# Altium footprint library goldpin_pcb.PcbLib: 235 footprints (part 10 of 15)
Each footprint in its own frame and in the unit in brackets; x right, y up, seen from the top. Pads: shape width x height; smd on the part's side, far side on the other; paste and mask are expansions set on the pad; w line width, h text height; cw(c..) or ccw(c..) is an arc to the next point about the centre after c.
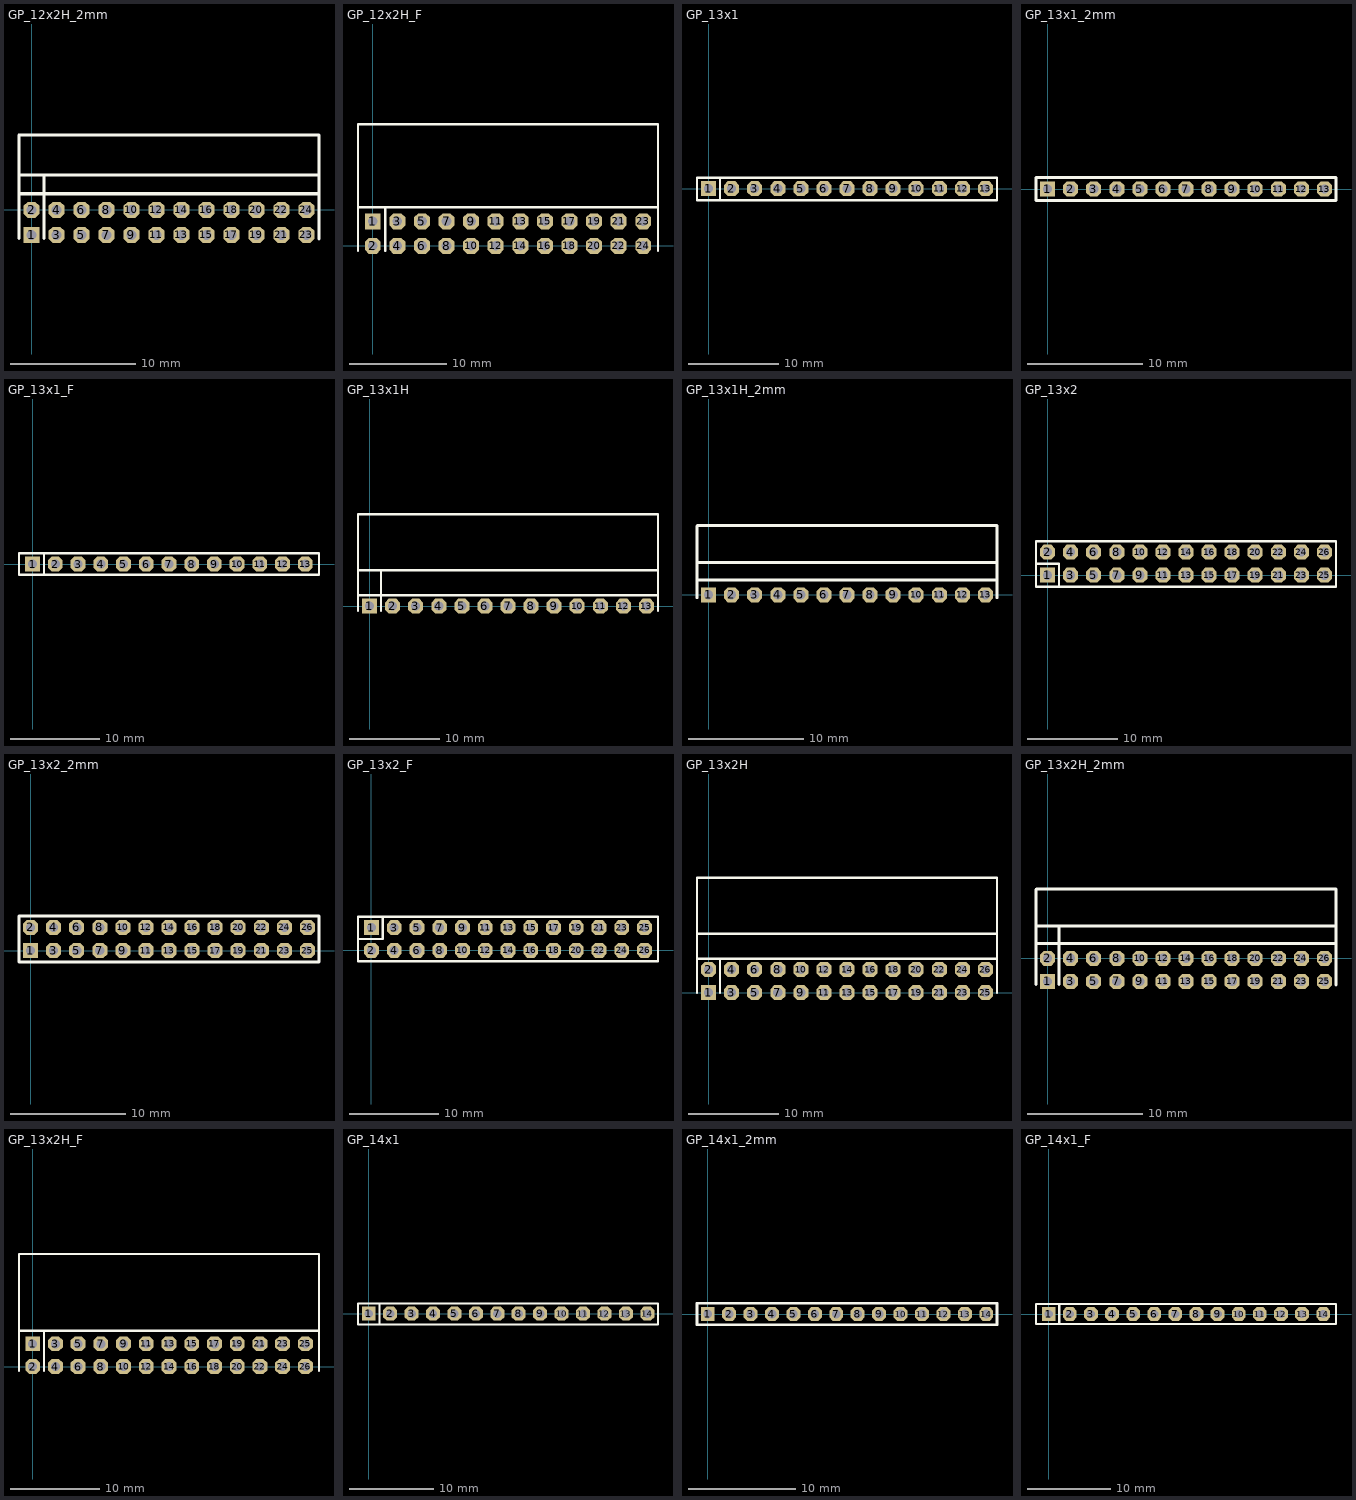
[diagram p9: the footprints below, top view; thin cyan lines are the x and y axes]

## GP_12x2H_2mm [mm]
height 4.45
pads (24):
  rect 1.3x1.3 hole 0.8: 1(0,-2)
  oct 1.3x1.3 hole 0.8: 2(0,0) 3(2,-2) 4(2,0) 5(4,-2) 6(4,0) 7(6,-2) 8(6,0) 9(8,-2) 10(8,0) 11(10,-2) 12(10,0) 13(12,-2) 14(12,0) 15(14,-2) 16(14,0) 17(16,-2) 18(16,0) 19(18,-2) 20(18,0) 21(20,-2) 22(20,0) 23(22,-2) 24(22,0)
Top Overlay:
  lines w0.254: -1,-2.275 -1,1.822 -1,5.973 ; -1,1.3 23,1.3 ; -1,2.8 23,2.8 ; 0.99,-2.275 0.99,2.775 ; 23,-2.3 23,6
  lines w0.256: -1,5.973 -0.973,6 23,6
3D body: height 3.97, standoff -3.02, extent -1.025,-2.261 22.975,5.961

## GP_12x2H_F [mil]
pads (24):
  rect 65x65 hole 39.37: 1(0,100)
  oct 65x65 hole 39.37: 2(0,0) 3(100,100) 4(100,0) 5(200,100) 6(200,0) 7(300,100) 8(300,0) 9(400,100) 10(400,0) 11(500,100) 12(500,0) 13(600,100) 14(600,0) 15(700,100) 16(700,0) 17(800,100) 18(800,0) 19(900,100) 20(900,0) 21(1000,100) 22(1000,0) 23(1100,100) 24(1100,0)
Top Overlay:
  lines w10: -60,-20 -60,495 1160,495 1160,-20 ; -60,157.24 1160,157.24 ; 50,-20 50,157.24
3D body: height 197.89, standoff -97.11, extent -59.06,-11.81 1160.94,491.19

## GP_13x1 [mil]
pads (13):
  rect 65x65 hole 39.37: 1(0,0)
  oct 65x65 hole 39.37: 2(100,0) 3(200,0) 4(300,0) 5(400,0) 6(500,0) 7(600,0) 8(700,0) 9(800,0) 10(900,0) 11(1000,0) 12(1100,0) 13(1200,0)
Top Overlay:
  lines w10: 50,-50 50,47.24 ; -50,-50 1250,-50 1250,47.24 -50,47.24 -50,-50
3D body: height 330, standoff -115, extent -50,-50 1250,50

## GP_13x1_2mm [mm]
height 4.45
pads (13):
  rect 1.3x1.3 hole 0.8: 1(0,0)
  oct 1.3x1.3 hole 0.8: 2(2,0) 3(4,0) 4(6,0) 5(8,0) 6(10,0) 7(12,0) 8(14,0) 9(16,0) 10(18,0) 11(20,0) 12(22,0) 13(24,0)
Top Overlay:
  lines w0.254: -1,-1 -1,1 25,1 25,-1 -1,-1
3D body: height 5.51, standoff -2.69, extent -1,-0.99 25,0.991

## GP_13x1_F [mil]
pads (13):
  rect 65x65 hole 39.37: 1(0,0)
  oct 65x65 hole 39.37: 2(100,0) 3(200,0) 4(300,0) 5(400,0) 6(500,0) 7(600,0) 8(700,0) 9(800,0) 10(900,0) 11(1000,0) 12(1100,0) 13(1200,0)
Top Overlay:
  lines w10: 50,-47.24 50,45 ; -60,-47.24 1260.63,-47.24 1260.63,47.24 -60,47.24 -60,-47.24
3D body: height 335, standoff -104, extent -60,-47.5 1260,47.5

## GP_13x1H [mil]
pads (13):
  rect 65x65 hole 39.37: 1(0,0)
  oct 65x65 hole 39.37: 2(100,0) 3(200,0) 4(300,0) 5(400,0) 6(500,0) 7(600,0) 8(700,0) 9(800,0) 10(900,0) 11(1000,0) 12(1100,0) 13(1200,0)
Top Overlay:
  lines w10: -50,-19.68 -50,80.31 -50,397.64 1250,397.64 1250,-19.68 ; -50,47.24 1250,47.24 ; -50,155.51 1250,155.51 ; 49.21,155.51 50,154.72 50,80.31 50,-19.68
3D body: height 120, standoff -90, extent -50,-10 1250,392.5

## GP_13x1H_2mm [mm]
height 4.45
pads (13):
  rect 1.3x1.3 hole 0.8: 1(0,0)
  oct 1.3x1.3 hole 0.8: 2(2,0) 3(4,0) 4(6,0) 5(8,0) 6(10,0) 7(12,0) 8(14,0) 9(16,0) 10(18,0) 11(20,0) 12(22,0) 13(24,0)
Top Overlay:
  lines w0.254: -1,-0.25 -1,1.822 -1,5.973 ; -1,1.3 25,1.3 ; -1,2.8 25,2.8
  lines w0.256: -1,5.973 -0.973,6 25,6 25,-0.25
3D body: height 1.99, standoff -3.04, extent -1,-0.25 25,5.973

## GP_13x2 [mil]
pads (26):
  rect 65x65 hole 39.37: 1(0,0)
  oct 65x65 hole 39.37: 2(0,100) 3(100,0) 4(100,100) 5(200,0) 6(200,100) 7(300,0) 8(300,100) 9(400,0) 10(400,100) 11(500,0) 12(500,100) 13(600,0) 14(600,100) 15(700,0) 16(700,100) 17(800,0) 18(800,100) 19(900,0) 20(900,100) 21(1000,0) 22(1000,100) 23(1100,0) 24(1100,100) 25(1200,0) 26(1200,100)
Top Overlay:
  lines w10: -50,50 50,50 50,-50 ; -50,-50 -50,147.24 1250,147.24 1250,-50 -50,-50
3D body: height 330, standoff -115, extent -50,-50 1250,150

## GP_13x2_2mm [mm]
height 4.45
pads (26):
  rect 1.3x1.3 hole 0.8: 1(0,0)
  oct 1.3x1.3 hole 0.8: 2(0,2) 3(2,0) 4(2,2) 5(4,0) 6(4,2) 7(6,0) 8(6,2) 9(8,0) 10(8,2) 11(10,0) 12(10,2) 13(12,0) 14(12,2) 15(14,0) 16(14,2) 17(16,0) 18(16,2) 19(18,0) 20(18,2) 21(20,0) 22(20,2) 23(22,0) 24(22,2) 25(24,0) 26(24,2)
Top Overlay:
  lines w0.254: -1,-1 25,-1 25,2.999 -1,2.999 -1,-1
3D body: height 6.51, standoff -1.69, extent -1,-0.968 25,2.969

## GP_13x2_F [mil]
pads (26):
  rect 65x65 hole 39.37: 1(0,100)
  oct 65x65 hole 39.37: 2(0,0) 3(100,100) 4(100,0) 5(200,100) 6(200,0) 7(300,100) 8(300,0) 9(400,100) 10(400,0) 11(500,100) 12(500,0) 13(600,100) 14(600,0) 15(700,100) 16(700,0) 17(800,100) 18(800,0) 19(900,100) 20(900,0) 21(1000,100) 22(1000,0) 23(1100,100) 24(1100,0) 25(1200,100) 26(1200,0)
Top Overlay:
  lines w10: -59.06,50 50,50 50,147.51 ; -59.06,-47.49 1259.06,-47.49 1259.06,147.49 -59.06,147.51 -59.06,-47.49
3D body: height 335, standoff -104, extent -60,-47.49 1260,147.51

## GP_13x2H [mil]
pads (26):
  rect 65x65 hole 39.37: 1(0,0)
  oct 65x65 hole 39.37: 2(0,100) 3(100,0) 4(100,100) 5(200,0) 6(200,100) 7(300,0) 8(300,100) 9(400,0) 10(400,100) 11(500,0) 12(500,100) 13(600,0) 14(600,100) 15(700,0) 16(700,100) 17(800,0) 18(800,100) 19(900,0) 20(900,100) 21(1000,0) 22(1000,100) 23(1100,0) 24(1100,100) 25(1200,0) 26(1200,100)
Top Overlay:
  lines w10: -50,0 -50,180.31 -50,497.64 1250,497.64 1250,0 ; -50,147.24 1250,147.24 ; -50,255.51 1250,255.51 ; 49.21,255.51 50,254.72 ; 50,0 50,147.24
3D body: height 220, standoff -90, extent -50,-10 1250,492.5

## GP_13x2H_2mm [mm]
height 4.45
pads (26):
  rect 1.3x1.3 hole 0.8: 1(0,-2)
  oct 1.3x1.3 hole 0.8: 2(0,0) 3(2,-2) 4(2,0) 5(4,-2) 6(4,0) 7(6,-2) 8(6,0) 9(8,-2) 10(8,0) 11(10,-2) 12(10,0) 13(12,-2) 14(12,0) 15(14,-2) 16(14,0) 17(16,-2) 18(16,0) 19(18,-2) 20(18,0) 21(20,-2) 22(20,0) 23(22,-2) 24(22,0) 25(24,-2) 26(24,0)
Top Overlay:
  lines w0.254: -1,-2.275 -1,1.822 -1,5.973 ; -1,1.3 25,1.3 ; -1,2.8 25,2.8 ; 0.99,-2.275 0.99,2.775 ; 25,-2.3 25,6
  lines w0.256: -1,5.973 -0.973,6 25,6
3D body: height 3.97, standoff -3.02, extent -1.025,-2.261 24.975,5.961

## GP_13x2H_F [mil]
pads (26):
  rect 65x65 hole 39.37: 1(0,100)
  oct 65x65 hole 39.37: 2(0,0) 3(100,100) 4(100,0) 5(200,100) 6(200,0) 7(300,100) 8(300,0) 9(400,100) 10(400,0) 11(500,100) 12(500,0) 13(600,100) 14(600,0) 15(700,100) 16(700,0) 17(800,100) 18(800,0) 19(900,100) 20(900,0) 21(1000,100) 22(1000,0) 23(1100,100) 24(1100,0) 25(1200,100) 26(1200,0)
Top Overlay:
  lines w10: -60,-20 -60,495 1260,495 1260,-20 ; -60,157.24 1259.84,157.24 ; 50,-20 50,157.24
3D body: height 197.89, standoff -97.11, extent -59.06,-11.81 1260.94,491.19

## GP_14x1 [mil]
pads (14):
  rect 65x65 hole 39.37: 1(0,0)
  oct 65x65 hole 39.37: 2(100,0) 3(200,0) 4(300,0) 5(400,0) 6(500,0) 7(600,0) 8(700,0) 9(800,0) 10(900,0) 11(1000,0) 12(1100,0) 13(1200,0) 14(1300,0)
Top Overlay:
  lines w10: 50,-50 50,47.24 ; -50,-50 1350,-50 1350,47.24 -50,47.24 -50,-50
3D body: height 330, standoff -115, extent -50,-50 1350,50

## GP_14x1_2mm [mm]
height 4.45
pads (14):
  rect 1.3x1.3 hole 0.8: 1(0,0)
  oct 1.3x1.3 hole 0.8: 2(2,0) 3(4,0) 4(6,0) 5(8,0) 6(10,0) 7(12,0) 8(14,0) 9(16,0) 10(18,0) 11(20,0) 12(22,0) 13(24,0) 14(26,0)
Top Overlay:
  lines w0.254: -1,-1 27,-1 27,1 -1,1 -1,-1
3D body: height 5.51, standoff -2.69, extent -1,-0.99 27,0.991

## GP_14x1_F [mil]
pads (14):
  rect 65x65 hole 39.37: 1(0,0)
  oct 65x65 hole 39.37: 2(100,0) 3(200,0) 4(300,0) 5(400,0) 6(500,0) 7(600,0) 8(700,0) 9(800,0) 10(900,0) 11(1000,0) 12(1100,0) 13(1200,0) 14(1300,0)
Top Overlay:
  lines w10: 50,-47.24 50,45 ; -60,-47.24 -60,47.24 1360.63,47.24 1360.63,-47.24 -60,-47.24
3D body: height 335, standoff -104, extent -60,-47.5 1360,47.5